# Altium footprint library 2.52-直插元件.PcbLib: 467 footprints (part 25 of 30)
Each footprint in its own frame and in the unit in brackets; x right, y up, seen from the top. Pads: shape width x height; smd on the part's side, far side on the other; paste and mask are expansions set on the pad; w line width, h text height; cw(c..) or ccw(c..) is an arc to the next point about the centre after c.
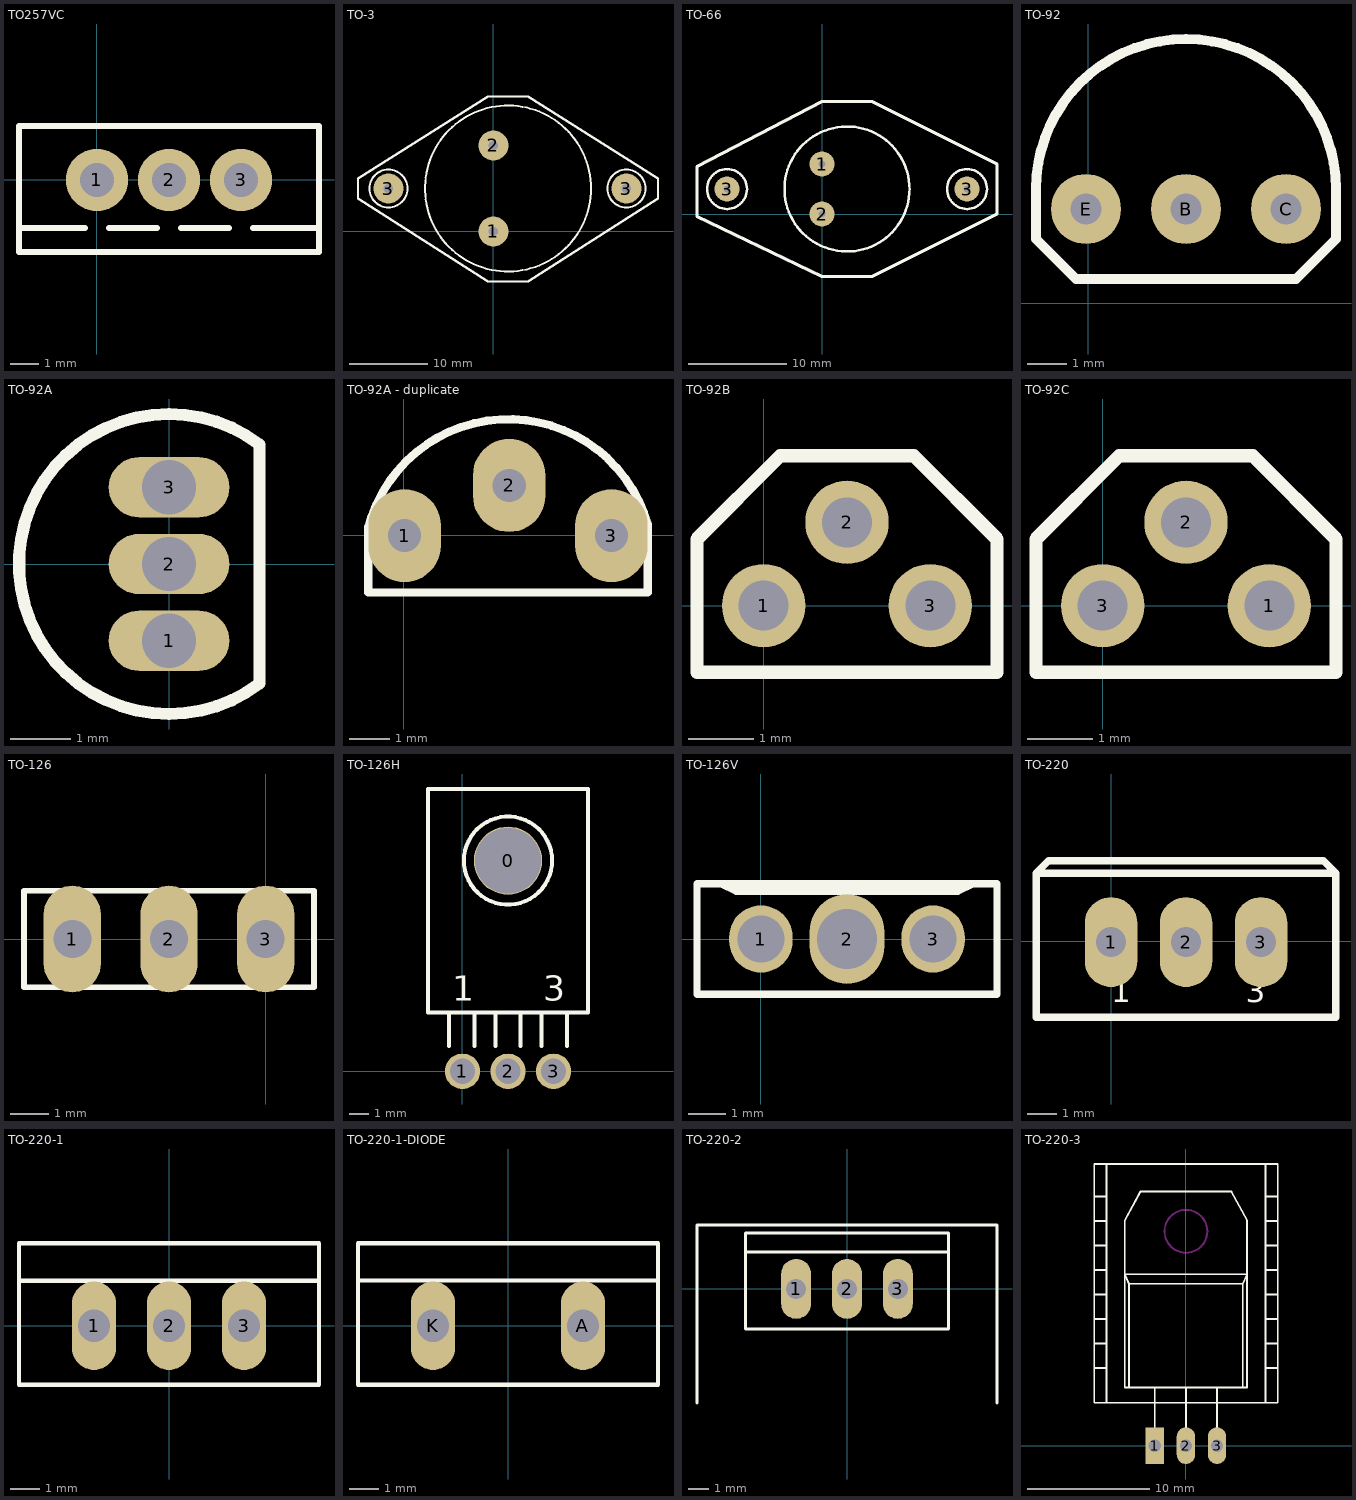
[diagram p24: the footprints below, top view; thin cyan lines are the x and y axes]

## TO257VC [mm]
pads (3):
  round 2.2 hole 1.2: 1(0,0) 2(2.54,0) 3(5.08,0)
Top Overlay:
  lines w0.2: -2.752,-1.693 -0.423,-1.693 ; 0.423,-1.693 2.117,-1.693 ; 2.963,-1.693 4.657,-1.693 ; 5.503,-1.693 7.832,-1.693 ; -2.752,-2.54 7.832,-2.54 7.832,1.905 -2.752,1.905 -2.752,-2.54

## TO-3 [mm]
pads (4):
  round 3.81 hole 1.2: 1(0,0) 2(0,10.922) 3(-13.335,5.461) 3(16.891,5.461)
Top Overlay:
  circle w0.254: c1.854,5.461 r10.541
  circle w0.254: c16.891,5.461 r2.413
  circle w0.254: c-13.335,5.461 r2.413
  lines w0.305: -17.196,4.191 -0.686,-6.35 4.394,-6.35 20.904,4.191 20.904,6.731 4.394,17.145 -0.686,17.145 -17.196,6.731 -17.196,4.191

## TO-66 [mil]
pads (4):
  round 100 hole 28: 1(0,200) 2(0,0) 3(-380,100) 3(580,100)
Top Overlay:
  circle w10: c100,100 r250
  circle w10: c-380,100 r80
  circle w10: c580,100 r80
  lines w12: -500,-10 -500,190 0,450 200,450 700,200 700,0 200,-250 0,-250 -500,-10

## TO-92 [mil]
pads (3):
  round 70 hole 31.5: B(98,94) C(198,94) E(-2,94)
Top Overlay:
  lines w10: -52,64 -52,114 cw(c98,114) 248,114 248,64 208,24 -12,24 -52,64

## TO-92A [mm]
height 6.86
pads (3):
  oval 2x1 hole 0.9: 1(0,-1.27) 2(0,0) 3(0,1.27)
Top Overlay:
  lines w0.2: 1.5,-1.98 cw(c0,0) 1.5,1.98 1.5,-1.98

## TO-92A - duplicate [mil]
pads (3):
  oval 70x90 hole 32: 1(0.83,-0.5) 2(102,48) 3(200.83,-0.5)
Top Overlay:
  lines w8: -34.55,6.14 cw(c101.24,-27.93) 236,10 ; -34.17,8 -34.17,-55.5 235.83,-55.5 235.83,9.5
3D body "User Library-TO-92-5.STEP": height 268.98, standoff -47.56, extent -11.81,-56 211.81,93.61

## TO-92B [mil] "封装库来自淘宝卖家 ID：黄晶宝石"
pads (3):
  round 50 hole 30: 1(0,0) 2(50,50) 3(100,0)
Top Overlay:
  lines w8: -40,-40 140,-40 140,40 90,90 10,90 -40,40 -40,-40
3D body "TO-92B.STEP": height 314.96, standoff -119.01, extent -44.49,-59.88 144.49,94.84

## TO-92C [mil] "淘宝ID:黄晶宝石   店铺网址:https://shop463601444.taobao.com"
pads (3):
  round 50 hole 30: 1(100,0) 2(50,50) 3(0,0)
Top Overlay:
  lines w8: -40,-40 -40,40 10,90 90,90 140,40 140,-40 -40,-40
3D body "TO-92B.STEP": height 314.96, standoff -119.01, extent -44.49,-59.88 144.49,94.84

## TO-126 [mm] "封装库来自淘宝卖家 ID：黄晶宝石"
pads (3):
  oval 1.5x2.8 hole 1: 1(-5.08,0) 2(-2.54,0) 3(0,0)
Top Overlay:
  lines w0.15: -6.35,-1.27 1.27,-1.27 1.27,1.27 -6.35,1.27 -6.35,-1.27
3D body "User Library-KT315.step": height 6.5, standoff -4.5, extent -6.136,-1.496 1.056,1.496

## TO-126H [mil] "封装库来自淘宝卖家 ID：黄晶宝石"
pads (4):
  round 135 hole 130: 0(90,416.67)
  round 70 hole 50: 1(0,0) 2(90,0) 3(180,0)
Top Overlay:
  circle w7.87: c90,416.67 r87.19
  lines w7.87: -26.67,50 -26.67,116.67 ; 23.33,50 23.33,116.67 ; 65,50 65,116.67 ; 115,50 115,116.67 ; 156.67,50 156.67,116.67 ; 206.67,50 206.67,116.67 ; -26.67,116.67 248.33,116.67 248.33,558.33 -68.33,558.33 -68.33,116.67 -26.67,116.67
  text "1" at -20,140 h50
  text "3" at 160,140 h50
3D body "User Library-2N5194,SPNP,60V 1_5A 40W.step": height 100, standoff -62.5, extent -60,-16.34 240,578.66

## TO-126V [mm]
pads (3):
  oval 1.7x1.8 hole 1.27: 1(0,0) 3(4.614,0)
  oval 2x2.4 hole 1.6: 2(2.307,0)
Top Overlay:
  lines w0.2: -1.079,1.482 -0.656,1.282 5.27,1.282 5.694,1.482 ; -1.714,-1.482 -1.714,1.482 6.329,1.482 6.329,-1.482 -1.714,-1.482
3D body "SW3dPS-TO-126.STEP": height 10.94, standoff -16.86, extent -1.695,-1.935 6.305,1.315

## TO-220 [mil]
pads (3):
  oval 70x120 hole 40: 1(0,-1) 2(100,-1) 3(200,-1)
Top Overlay:
  lines w10: -100,90.67 -100,-100.56 -99.56,-101 299.56,-101 300,-100.56 300,90.67 ; -100,90.67 300,90.67 ; -100,90.67 -83.33,107.33 283.33,107.33 300,90.67
  text "3" at 180,-81 h30
  text "1" at 0,-81 h30
3D body "User Library-TO-220-1.STEP": height 740.16, standoff -392.91, extent -93.88,-84 295.88,93.17

## TO-220-1 [mm]
pads (3):
  oval 1.5x3 hole 1.1: 1(-2.54,0) 2(0,0) 3(2.54,0)
Top Overlay:
  lines w0.15: -5.08,1.524 5.08,1.521 ; -5.08,-2 -5.08,2.79 5.08,2.79 5.08,-2 -5.08,-2
3D body "IC1.STEP": height 19.5, standoff -4, extent -5.25,-1.955 5.25,2.745
3D body "User Library-POWER MOSFET, NON-SURFACE-MOUNT.step": height 18.3, standoff -10.08, extent -4.834,-1.996 4.818,2.504

## TO-220-1-DIODE [mm]
pads (2):
  oval 1.5x3 hole 1.1: A(2.54,0) K(-2.54,0)
Top Overlay:
  lines w0.15: -5.08,1.53 5.08,1.53 ; -5.08,-2 -5.08,2.79 5.08,2.79 5.08,-2 -5.08,-2
3D body "IC2.STEP": height 19.5, standoff -4, extent -5.25,-1.955 5.25,2.745

## TO-220-2 [mm]
pads (3):
  oval 1.5x3 hole 1: 1(-2.54,0) 2(0,0) 3(2.54,0)
Top Overlay:
  lines w0.15: -7.5,-5.713 -7.5,3.2 7.5,3.2 7.5,-5.713 ; -5.08,1.848 5.08,1.848 ; -5.08,-2 -5.08,2.79 5.08,2.79 5.08,-2 -5.08,-2
3D body "User Library-Package T0-220AB With Heatsing Vertical Mount-1.STEP": height 20.07, standoff -5.86, extent -8.5,-5.787 8.5,4.433

## TO-220-3 [mm]
pads (3):
  rect 1.5x3 hole 1: 1(-2.54,0)
  oval 1.5x3 hole 1: 2(0,0) 3(2.54,0)
Top Overlay:
  lines w0.15: -7.493,6.343 -6.493,6.343 ; -7.493,8.343 -6.493,8.343 ; -7.493,10.343 -6.493,10.343 ; -7.493,12.343 -6.493,12.343 ; -7.493,14.343 -6.493,14.343 ; -7.493,16.343 -6.493,16.343 ; -7.493,18.343 -6.493,18.343 ; -7.493,20.343 -6.493,20.343 ; -6.493,3.505 -6.493,23.005 ; -5,14 5,14 ; -5,14.005 -4.644,13.217 ; -5,18.377 -5,4.75 5,4.75 5,18.377 ; -5,18.388 -3.712,20.75 3.712,20.75 5,18.388 ; -4.644,4.75 -4.644,13.217 ; -2.54,0 -2.54,4.75 ; 0,0 0,4.75 ; 2.54,0 2.54,4.75 ; 4.644,4.75 4.644,13.217 ; 5,14.005 4.644,13.217 ; 6.507,3.505 6.507,23.005 ; 6.507,6.343 7.507,6.343 ; 6.507,8.343 7.507,8.343 ; 6.507,10.343 7.507,10.343 ; 6.507,12.343 7.507,12.343 ; 6.507,14.343 7.507,14.343 ; 6.507,16.343 7.507,16.343 ; 6.507,18.343 7.507,18.343 ; 6.507,20.343 7.507,20.343 ; -4.644,13.217 4.644,13.217 ; -7.493,3.505 -7.493,23.005 7.507,23.005 7.507,3.505 -7.493,3.505
Keep-Out Layer:
  circle w0.15: c0,17.5 r1.75
  circle w0.15: c0.007,17.505 r1.75
3D body "User Library-TO-220-2.step": height 10.39, standoff -2.31, extent -5.85,-0.325 5.864,21.773